# Altium footprint library goldpin_pcb.PcbLib: 235 footprints (part 6 of 15)
Each footprint in its own frame and in the unit in brackets; x right, y up, seen from the top. Pads: shape width x height; smd on the part's side, far side on the other; paste and mask are expansions set on the pad; w line width, h text height; cw(c..) or ccw(c..) is an arc to the next point about the centre after c.
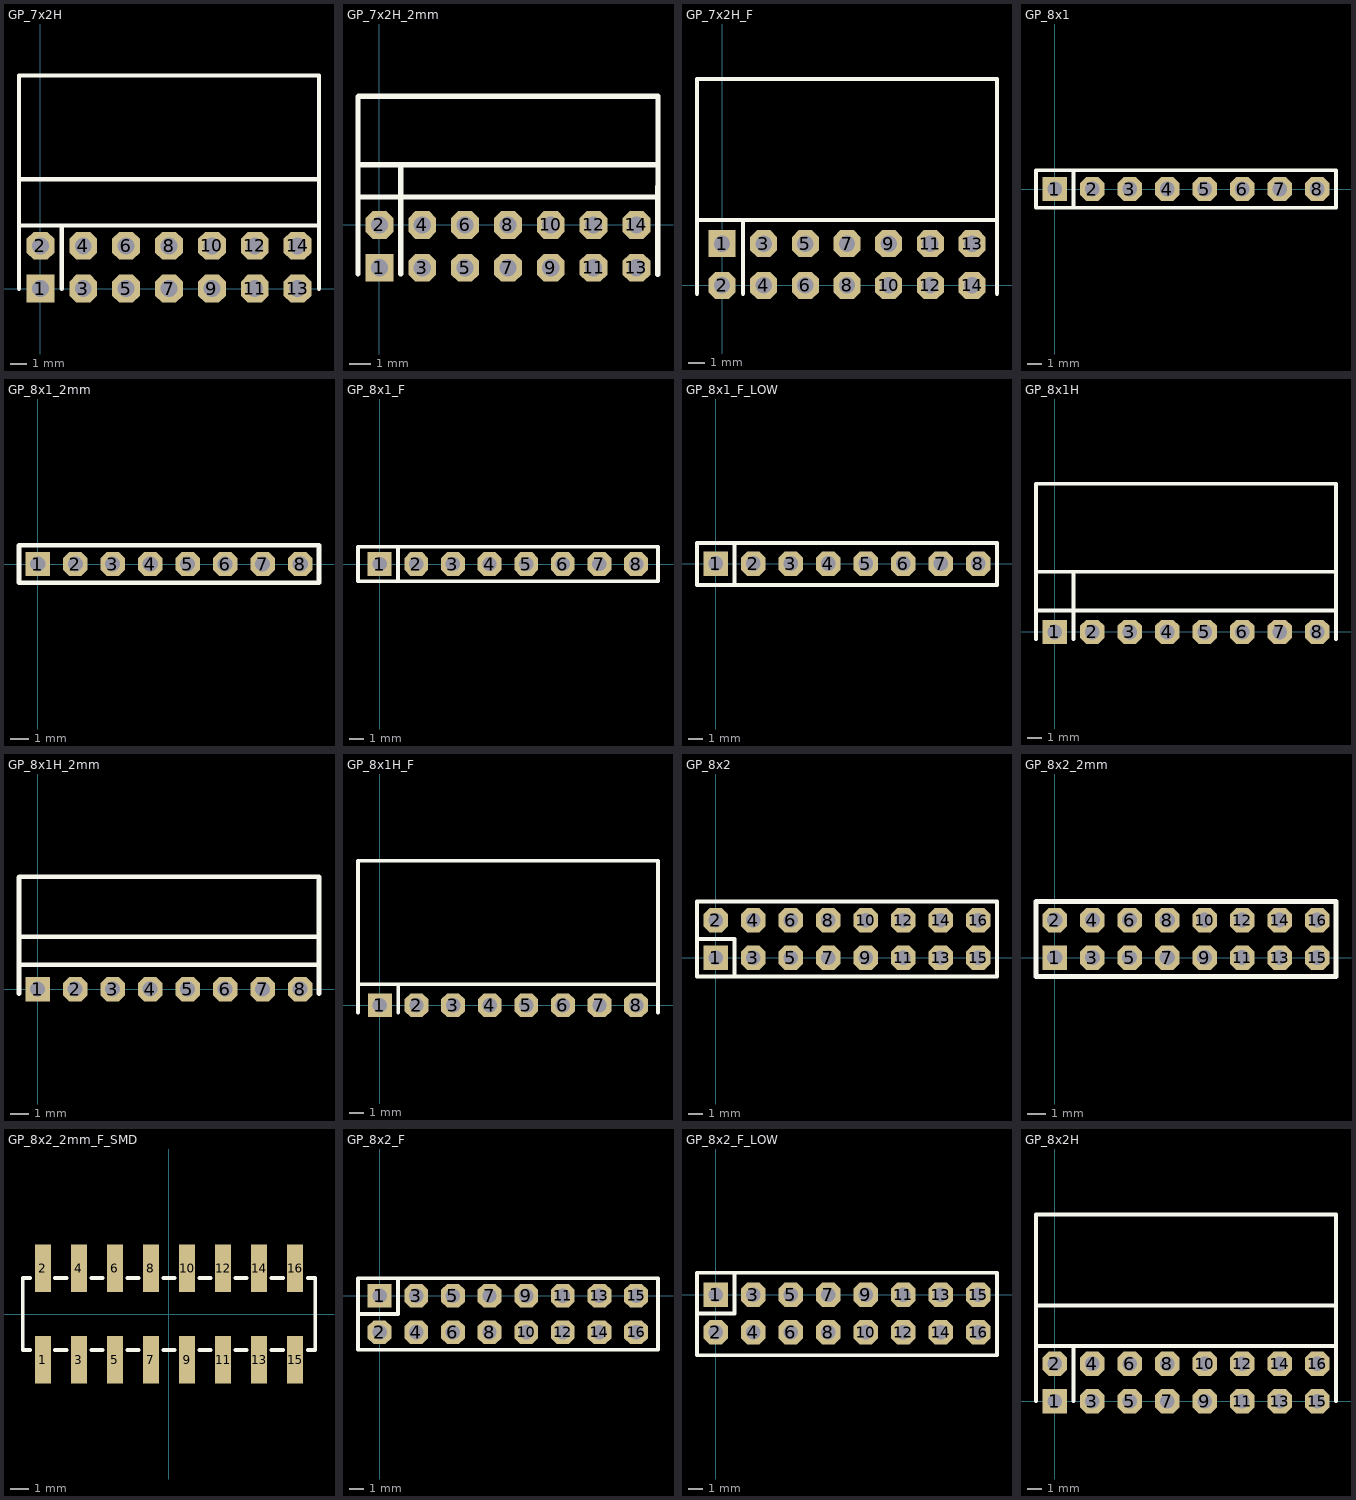
[diagram p5: the footprints below, top view; thin cyan lines are the x and y axes]

## GP_7x2H [mil]
pads (14):
  rect 65x65 hole 39.37: 1(0,0)
  oct 65x65 hole 39.37: 2(0,100) 3(100,0) 4(100,100) 5(200,0) 6(200,100) 7(300,0) 8(300,100) 9(400,0) 10(400,100) 11(500,0) 12(500,100) 13(600,0) 14(600,100)
Top Overlay:
  lines w10: -50,0 -50,180.31 -50,497.64 650,497.64 650,0 ; -50,147.24 650,147.24 ; -50,255.51 650,255.51 ; 49.21,255.51 50,254.72 ; 50,0 50,147.24
3D body: height 220.08, standoff -89.92, extent -50,-12.5 650,490

## GP_7x2H_2mm [mm]
height 4.45
pads (14):
  rect 1.3x1.3 hole 0.8: 1(0,-2)
  oct 1.3x1.3 hole 0.8: 2(0,0) 3(2,-2) 4(2,0) 5(4,-2) 6(4,0) 7(6,-2) 8(6,0) 9(8,-2) 10(8,0) 11(10,-2) 12(10,0) 13(12,-2) 14(12,0)
Top Overlay:
  lines w0.254: -1,-2.275 -1,1.822 -1,5.973 ; -1,1.3 13.004,1.3 ; -1,2.8 13,2.8 ; 0.99,-2.275 0.99,2.775 ; 13,-2.3 13.01,5.975
  lines w0.256: -1,5.973 -0.973,6 13.01,6
3D body: height 3.97, standoff -3.02, extent -1.025,-2.261 12.975,5.961

## GP_7x2H_F [mil]
pads (14):
  rect 65x65 hole 39.37: 1(0,100)
  oct 65x65 hole 39.37: 2(0,0) 3(100,100) 4(100,0) 5(200,100) 6(200,0) 7(300,100) 8(300,0) 9(400,100) 10(400,0) 11(500,100) 12(500,0) 13(600,100) 14(600,0)
Top Overlay:
  lines w10: -60,-20 -60,495 660,495 660,-20 ; -60,157.24 660,157.24 ; 50,-20 50,157.24
3D body: height 197.89, standoff -97.11, extent -59.06,-10.87 660.94,492.13

## GP_8x1 [mil]
pads (8):
  rect 65x65 hole 39.37: 1(0,0)
  oct 65x65 hole 39.37: 2(100,0) 3(200,0) 4(300,0) 5(400,0) 6(500,0) 7(600,0) 8(700,0)
Top Overlay:
  lines w10: 50,-50 50,50 ; -50,-50 750,-50 750,50 -50,50 -50,-50
3D body: height 330, standoff -115, extent -50,-50 750,50

## GP_8x1_2mm [mm]
height 4.45
pads (8):
  rect 1.3x1.3 hole 0.8: 1(0,0)
  oct 1.3x1.3 hole 0.8: 2(2,0) 3(4,0) 4(6,0) 5(8,0) 6(10,0) 7(12,0) 8(14,0)
Top Overlay:
  lines w0.254: -1,-1 15,-1 15,1 -1,1 -1,-1
3D body: height 5.51, standoff -2.69, extent -1,-0.99 15,0.991

## GP_8x1_F [mil]
pads (8):
  rect 65x65 hole 39.37: 1(0,0)
  oct 65x65 hole 39.37: 2(100,0) 3(200,0) 4(300,0) 5(400,0) 6(500,0) 7(600,0) 8(700,0)
Top Overlay:
  lines w10: 50,-47.24 50,47.24 ; -59.06,-47.24 -59.06,47.24 759.84,47.24 759.84,-47.24 -59.06,-47.24
3D body: height 335, standoff -104, extent -60,-47.49 760,47.51

## GP_8x1_F_LOW [mil]
pads (8):
  rect 65x65 hole 39.37: 1(0,0)
  oct 65x65 hole 39.37: 2(100,0) 3(200,0) 4(300,0) 5(400,0) 6(500,0) 7(600,0) 8(700,0)
Top Overlay:
  lines w10: 50,-57.09 50,55.12 ; -50,-57.09 750,-57.09 750,55.12 -50,55.12 -50,-57.09
3D body: height 200.79, standoff -127.21, extent -51.18,-61.97 748.82,58.03

## GP_8x1H [mil]
pads (8):
  rect 65x65 hole 39.37: 1(0,0)
  oct 65x65 hole 39.37: 2(100,0) 3(200,0) 4(300,0) 5(400,0) 6(500,0) 7(600,0) 8(700,0)
Top Overlay:
  lines w10: -50,-19.68 -50,80.31 -50,395 750,395 750,-19.68 ; -50,57.24 750,57.24 ; -50,160.51 750,160.51 ; 50,-19.68 50,80.31 50,160
3D body: height 120, standoff -90, extent -50,-10 750,392.5

## GP_8x1H_2mm [mm]
height 4.45
pads (8):
  rect 1.3x1.3 hole 0.8: 1(0,0)
  oct 1.3x1.3 hole 0.8: 2(2,0) 3(4,0) 4(6,0) 5(8,0) 6(10,0) 7(12,0) 8(14,0)
Top Overlay:
  lines w0.254: -1,-0.25 -1,1.822 -1,5.973 ; -1,1.3 15,1.3 ; -1,2.8 15,2.8
  lines w0.256: -1,5.973 -0.973,6 15,6 15,-0.25
3D body: height 1.99, standoff -3.04, extent -1,-0.25 15,5.973

## GP_8x1H_F [mil]
pads (8):
  rect 65x65 hole 39.37: 1(0,0)
  oct 65x65 hole 39.37: 2(100,0) 3(200,0) 4(300,0) 5(400,0) 6(500,0) 7(600,0) 8(700,0)
Top Overlay:
  lines w10: -60,-20 -60,395 760,395 760,-20 ; -60,57.24 759.84,57.24 ; 50,-19.68 50,57.24
3D body: height 96.71, standoff -98.29, extent -60,-10 760,393

## GP_8x2 [mil]
pads (16):
  rect 65x65 hole 39.37: 1(0,0)
  oct 65x65 hole 39.37: 2(0,100) 3(100,0) 4(100,100) 5(200,0) 6(200,100) 7(300,0) 8(300,100) 9(400,0) 10(400,100) 11(500,0) 12(500,100) 13(600,0) 14(600,100) 15(700,0) 16(700,100)
Top Overlay:
  lines w10: -50,50 50,50 50,-50 ; -50,-50 -50,150 750,150 750,-50 -50,-50
3D body: height 330, standoff -115, extent -50,-50 750,150

## GP_8x2_2mm [mm]
height 4.45
pads (16):
  rect 1.3x1.3 hole 0.8: 1(0,0)
  oct 1.3x1.3 hole 0.8: 2(0,2) 3(2,0) 4(2,2) 5(4,0) 6(4,2) 7(6,0) 8(6,2) 9(8,0) 10(8,2) 11(10,0) 12(10,2) 13(12,0) 14(12,2) 15(14,0) 16(14,2)
Top Overlay:
  lines w0.254: -1,-1 -1,2.999 15,2.999 15,-1 -1,-1
3D body: height 6.51, standoff -1.69, extent -1,-0.968 15,2.969

## GP_8x2_2mm_F_SMD [mm]
pads (16):
  rect 0.89x2.65 smd: 1(-7,-2.54) 2(-7,2.54) 3(-5,-2.54) 4(-5,2.54) 5(-3,-2.54) 6(-3,2.54) 7(-1,-2.54) 8(-1,2.54) 9(1,-2.54) 10(1,2.54) 11(3,-2.54) 12(3,2.54) 13(5,-2.54) 14(5,2.54) 15(7,-2.54) 16(7,2.54)
Top Overlay:
  lines w0.2: -7.7,-2 -8.125,-2 -8.125,2 -7.7,2 ; -6.325,-2 -5.675,-2 ; -6.325,2 -5.675,2 ; -4.325,-2 -3.675,-2 ; -4.325,2 -3.675,2 ; -2.325,-2 -1.675,-2 ; -2.325,2 -1.675,2 ; -0.325,-2 0.325,-2 ; -0.325,2 0.325,2 ; 1.675,-2 2.325,-2 ; 1.675,2 2.325,2 ; 3.675,-2 4.325,-2 ; 3.675,2 4.325,2 ; 5.675,-2 6.325,-2 ; 5.675,2 6.325,2 ; 7.7,-2 8.125,-2 8.125,2 7.7,2
3D body: height 4.44, standoff -0.05, extent -8.125,-3.218 8.113,3.218

## GP_8x2_F [mil]
pads (16):
  rect 65x65 hole 39.37: 1(0,0)
  oct 65x65 hole 39.37: 2(0,-100) 3(100,0) 4(100,-100) 5(200,0) 6(200,-100) 7(300,0) 8(300,-100) 9(400,0) 10(400,-100) 11(500,0) 12(500,-100) 13(600,0) 14(600,-100) 15(700,0) 16(700,-100)
Top Overlay:
  lines w10: -59.06,-50 50,-50 50,47.51 ; -59.06,-147.49 759.84,-147.49 759.84,47.51 -59.06,47.51 -59.06,-147.49
3D body: height 335, standoff -104, extent -60,-147.49 760,47.51

## GP_8x2_F_LOW [mil]
pads (16):
  rect 65x65 hole 39.37: 1(0,0)
  oct 65x65 hole 39.37: 2(0,-100) 3(100,0) 4(100,-100) 5(200,0) 6(200,-100) 7(300,0) 8(300,-100) 9(400,0) 10(400,-100) 11(500,0) 12(500,-100) 13(600,0) 14(600,-100) 15(700,0) 16(700,-100)
Top Overlay:
  lines w10: -50,-50 50,-50 50,59.06 ; 750,-161.42 -50,-161.42 -50,59.06 750,59.06 750,-159.06
3D body: height 200.79, standoff -127.21, extent -49.6,-160.79 750.39,59.21

## GP_8x2H [mil]
pads (16):
  rect 65x65 hole 39.37: 1(0,0)
  oct 65x65 hole 39.37: 2(0,100) 3(100,0) 4(100,100) 5(200,0) 6(200,100) 7(300,0) 8(300,100) 9(400,0) 10(400,100) 11(500,0) 12(500,100) 13(600,0) 14(600,100) 15(700,0) 16(700,100)
Top Overlay:
  lines w10: -50,0 -50,180.31 -50,497.64 750,497.64 750,0 ; -50,147.24 750,147.24 ; -50,255.51 750,255.51 ; 49.21,255.51 50,254.72 ; 50,0 50,147.24
3D body: height 220, standoff -90, extent -50,-12.5 750,490